# Altium footprint library Hydra_Ref_pcb.PcbLib: 353 footprints (part 13 of 23)
Each footprint in its own frame and in the unit in brackets; x right, y up, seen from the top. Pads: shape width x height; smd on the part's side, far side on the other; paste and mask are expansions set on the pad; w line width, h text height; cw(c..) or ccw(c..) is an arc to the next point about the centre after c.
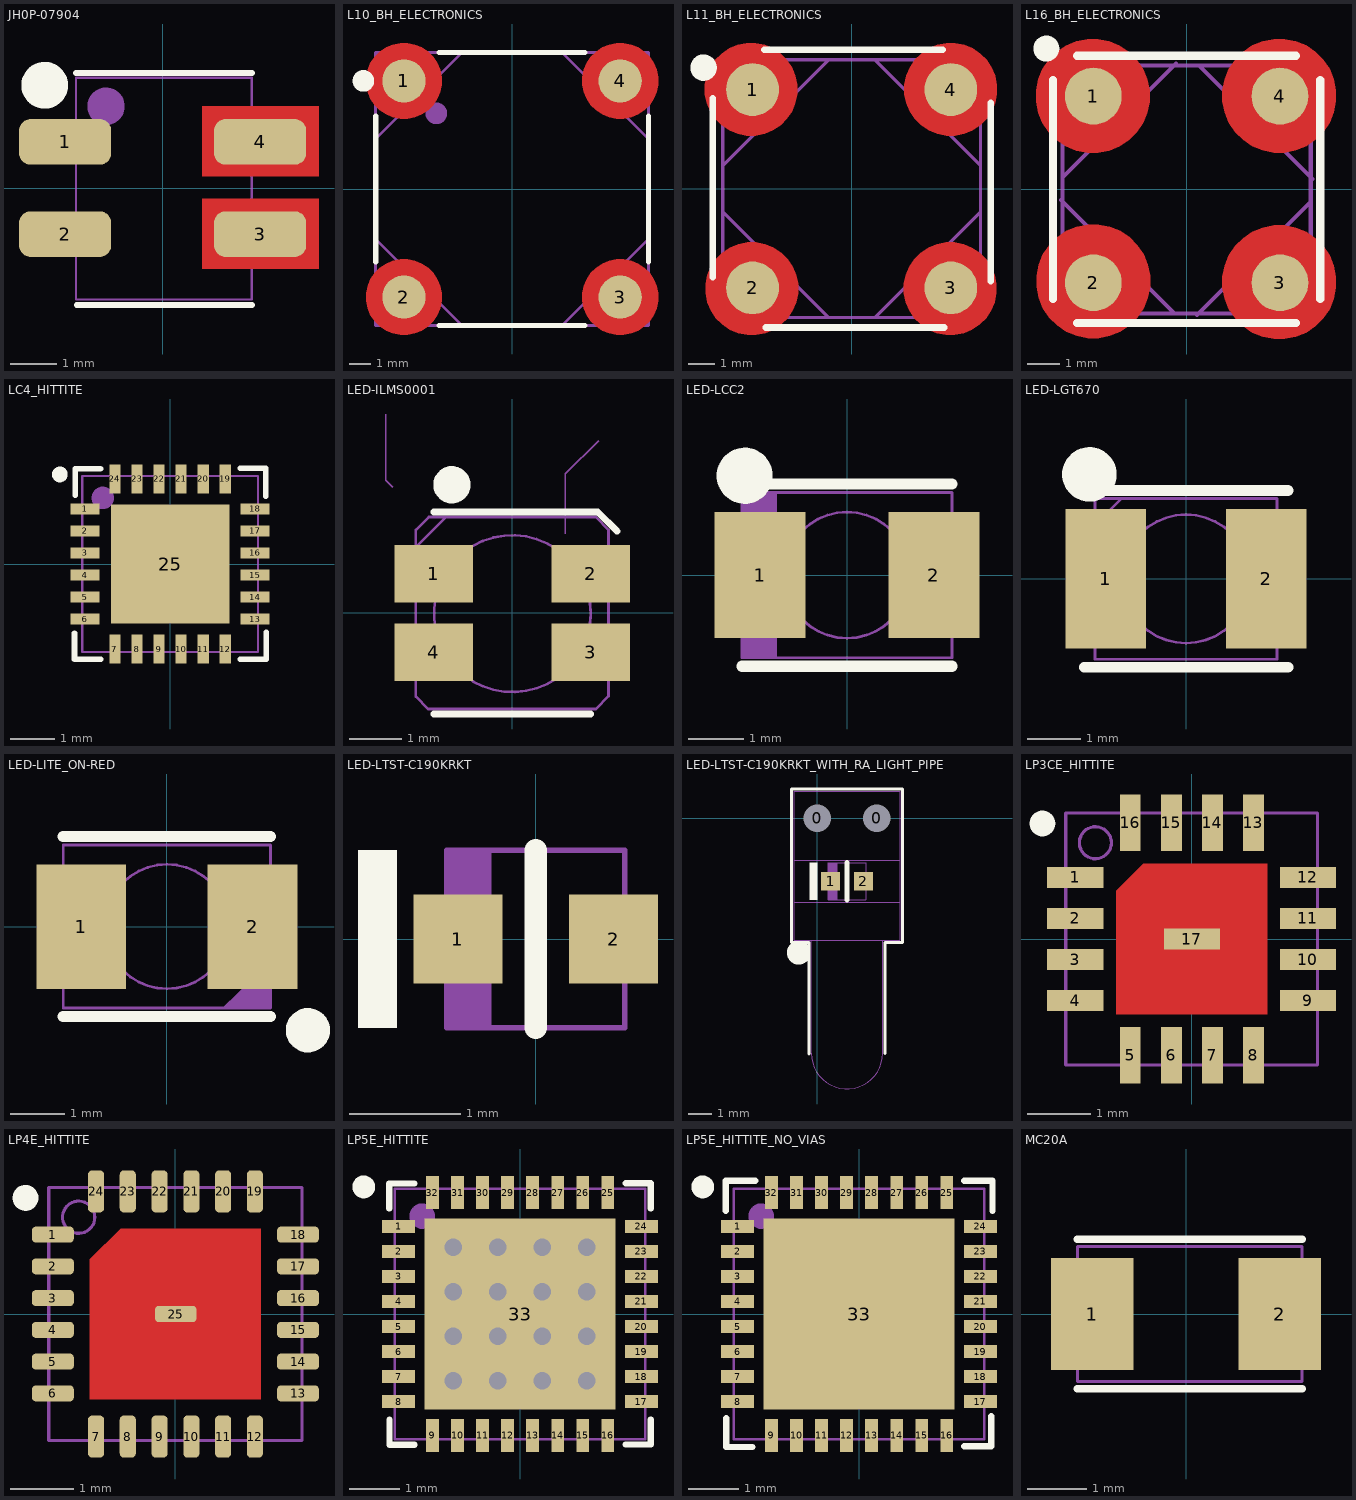
[diagram p12: the footprints below, top view; thin cyan lines are the x and y axes]

## JH0P-07904 [mil] "old part"
height 68.9
pads (4):
  rrect50% 79x39 smd: 1(-83.5,39.5) 2(-83.5,-39.5) 3(83.5,-39.5) 4(83.5,39.5)
Top Layer:
  pour cut-out: 134,-9 34,-9 34,-69 134,-69
  pour cut-out: 134,70 34,70 34,10 134,10
Top Overlay:
  circle w20: c-101,88 r10
  lines w5: -74.16,98.55 76.5,98.56 ; -73.5,-100.26 76.5,-100.26
9 Top Assy:
  circle w20: c-48.5,70 r6
  lines w2: -44.24,94.5 76.5,94.5 ; 76.5,94.5 76.5,-95.5 -74.16,-95.5 -74.16,94.5 76.5,94.5
  text ".Designator" at 44,-82 h50
3D body: height 68.9, standoff 0.39, extent -135,-110 135,110

## L10_BH_ELECTRONICS [mil]
height 260
pads (4):
  round 80 smd mask+3: 1(-200,200) 2(-200,-200) 3(200,-200) 4(200,200)
Top Layer:
  pour cut-out: -200,270 -193.11,270 -179.58,267.31 -166.84,262.03 -155.38,254.37 -145.63,244.62 -137.97,233.16 -132.69,220.42 -130,206.89 -130,200 -130,193.11 -132.69,179.58 -137.97,166.84 -145.63,155.38 -155.38,145.63 -166.84,137.97 -179.58,132.69 -193.11,130 -200,130 -206.89,130 -220.42,132.69 -233.16,137.97 -244.62,145.63 -254.37,155.38 -262.03,166.84 -267.31,179.58 -270,193.11 -270,200 -270,206.89 -267.31,220.42 -262.03,233.16 -254.37,244.62 -244.62,254.37 -233.16,262.03 -220.42,267.31 -206.89,270
  pour cut-out: 200,270 206.89,270 220.42,267.31 233.16,262.03 244.62,254.37 254.37,244.62 262.03,233.16 267.31,220.42 270,206.89 270,200 270,193.11 267.31,179.58 262.03,166.84 254.37,155.38 244.62,145.63 233.16,137.97 220.42,132.69 206.89,130 200,130 193.11,130 179.58,132.69 166.84,137.97 155.38,145.63 145.63,155.38 137.97,166.84 132.69,179.58 130,193.11 130,200 130,206.89 132.69,220.42 137.97,233.16 145.63,244.62 155.38,254.37 166.84,262.03 179.58,267.31 193.11,270
  pour cut-out: -200,-130 -193.11,-130 -179.58,-132.69 -166.84,-137.97 -155.38,-145.63 -145.63,-155.38 -137.97,-166.84 -132.69,-179.58 -130,-193.11 -130,-200 -130,-206.89 -132.69,-220.42 -137.97,-233.16 -145.63,-244.62 -155.38,-254.37 -166.84,-262.03 -179.58,-267.31 -193.11,-270 -200,-270 -206.89,-270 -220.42,-267.31 -233.16,-262.03 -244.62,-254.37 -254.37,-244.62 -262.03,-233.16 -267.31,-220.42 -270,-206.89 -270,-200 -270,-193.11 -267.31,-179.58 -262.03,-166.84 -254.37,-155.38 -244.62,-145.63 -233.16,-137.97 -220.42,-132.69 -206.89,-130
  pour cut-out: 200,-130 206.89,-130 220.42,-132.69 233.16,-137.97 244.62,-145.63 254.37,-155.38 262.03,-166.84 267.31,-179.58 270,-193.11 270,-200 270,-206.89 267.31,-220.42 262.03,-233.16 254.37,-244.62 244.62,-254.37 233.16,-262.03 220.42,-267.31 206.89,-270 200,-270 193.11,-270 179.58,-267.31 166.84,-262.03 155.38,-254.37 145.63,-244.62 137.97,-233.16 132.69,-220.42 130,-206.89 130,-200 130,-193.11 132.69,-179.58 137.97,-166.84 145.63,-155.38 155.38,-145.63 166.84,-137.97 179.58,-132.69 193.11,-130
Top Overlay:
  circle w20: c-275,200 r10
  lines w10: -252.5,-135 -252.5,135 ; -135,-252.5 135,-252.5 ; -135,252.5 135,252.5 ; 252.5,-135 252.5,135
9 Top Assy:
  circle w20: c-140,140 r10
  lines w5: -252.25,-92.75 -92.5,-252.5 ; -252.25,92.75 -92.75,252.25 ; -115,252.5 -105,252.5 ; 92.75,-252.25 252.75,-92.25 ; 92.75,252.25 252.5,92.5 ; -252.5,-252.5 252.5,-252.5 252.5,252.5 -252.5,252.5 -252.5,-252.5
  text ".Designator" at -145,-15 h38
3D body: height 260, standoff 0, extent -252.5,-252.5 252.5,252.5

## L11_BH_ELECTRONICS [mil]
height 195
pads (4):
  round 80 smd mask+3: 1(-150,150) 2(-150,-150) 3(150,-150) 4(150,150)
Top Layer:
  pour cut-out: 148.89,-81.08 155.78,-81.08 169.31,-83.77 182.05,-89.05 193.51,-96.71 203.26,-106.46 210.92,-117.92 216.2,-130.66 218.89,-144.19 218.89,-151.08 218.89,-157.98 216.2,-171.5 210.92,-184.24 203.26,-195.7 193.51,-205.45 182.05,-213.12 169.31,-218.39 155.78,-221.08 148.89,-221.08 141.99,-221.08 128.47,-218.39 115.73,-213.12 104.27,-205.45 94.52,-195.7 86.86,-184.24 81.58,-171.5 78.89,-157.98 78.89,-151.08 78.89,-144.19 81.58,-130.66 86.86,-117.92 94.52,-106.46 104.27,-96.71 115.73,-89.05 128.47,-83.77 141.99,-81.08
  pour cut-out: -151.02,-81.08 -144.12,-81.08 -130.6,-83.77 -117.86,-89.05 -106.39,-96.71 -96.64,-106.46 -88.98,-117.92 -83.71,-130.66 -81.02,-144.19 -81.02,-151.08 -81.02,-157.98 -83.71,-171.5 -88.98,-184.24 -96.64,-195.7 -106.39,-205.46 -117.86,-213.12 -130.6,-218.39 -144.12,-221.08 -151.02,-221.08 -157.91,-221.08 -171.43,-218.39 -184.17,-213.12 -195.64,-205.46 -205.39,-195.7 -213.05,-184.24 -218.33,-171.5 -221.02,-157.98 -221.02,-151.08 -221.02,-144.19 -218.33,-130.66 -213.05,-117.92 -205.39,-106.46 -195.64,-96.71 -184.17,-89.05 -171.43,-83.77 -157.91,-81.08
  pour cut-out: 149.89,220.14 156.78,220.14 170.31,217.45 183.05,212.17 194.51,204.51 204.26,194.76 211.92,183.3 217.2,170.56 219.89,157.03 219.89,150.14 219.89,143.24 217.2,129.72 211.92,116.98 204.26,105.52 194.51,95.77 183.05,88.11 170.31,82.83 156.78,80.14 149.89,80.14 142.99,80.14 129.47,82.83 116.73,88.11 105.27,95.77 95.52,105.52 87.86,116.98 82.58,129.72 79.89,143.24 79.89,150.14 79.89,157.03 82.58,170.56 87.86,183.3 95.52,194.76 105.27,204.51 116.73,212.17 129.47,217.45 142.99,220.14
  pour cut-out: -152.34,220.14 -145.44,220.14 -131.92,217.45 -119.18,212.17 -107.71,204.51 -97.96,194.76 -90.3,183.3 -85.03,170.56 -82.34,157.03 -82.34,150.14 -82.34,143.24 -85.03,129.72 -90.3,116.98 -97.96,105.52 -107.71,95.77 -119.18,88.11 -131.92,82.83 -145.44,80.14 -152.34,80.14 -159.23,80.14 -172.76,82.83 -185.49,88.11 -196.96,95.77 -206.71,105.52 -214.37,116.98 -219.65,129.72 -222.34,143.24 -222.34,150.14 -222.34,157.03 -219.65,170.56 -214.37,183.3 -206.71,194.76 -196.96,204.51 -185.49,212.17 -172.76,217.45 -159.23,220.14
Top Overlay:
  circle w20: c-224.07,183.14 r10
  lines w10: -210,-133.58 -210,136.42 ; -132.02,210 137.98,210 ; -130,-210 140,-210 ; 210.62,-140 210.62,130
9 Top Assy:
  circle w20: c-140,140 r10
  lines w5: -195,-35 -35.25,-194.75 ; -194.5,35.5 -35,195 ; 35,-195 195,-35 ; 35,195 194.75,35.25 ; -195,-195 -195,195 195,195 195,-195 -195,-195
  text ".Designator" at -145,-15 h38
3D body: height 195, standoff 0, extent -195,-195 195,195
3D body: height 260, standoff 0, extent -195,195 195,195

## L16_BH_ELECTRONICS [mil]
height 150
pads (4):
  round 70 smd mask+3: 1(-115,115) 2(-115,-115) 3(115,-115) 4(115,115)
Top Layer:
  pour cut-out: 114.11,-44.34 121,-44.34 134.53,-47.03 147.27,-52.3 158.73,-59.96 168.48,-69.71 176.14,-81.18 181.42,-93.92 184.11,-107.44 184.11,-114.34 184.11,-121.23 181.42,-134.76 176.14,-147.49 168.48,-158.96 158.73,-168.71 147.27,-176.37 134.53,-181.65 121,-184.34 114.11,-184.34 107.22,-184.34 93.69,-181.65 80.95,-176.37 69.49,-168.71 59.74,-158.96 52.08,-147.49 46.8,-134.76 44.11,-121.23 44.11,-114.34 44.11,-107.44 46.8,-93.92 52.08,-81.18 59.74,-69.71 69.49,-59.96 80.95,-52.3 93.69,-47.03 107.22,-44.34
  pour cut-out: -115,-43.27 -108.11,-43.27 -94.58,-45.96 -81.84,-51.23 -70.38,-58.89 -60.63,-68.64 -52.97,-80.11 -47.69,-92.85 -45,-106.37 -45,-113.27 -45,-120.16 -47.69,-133.68 -52.97,-146.42 -60.63,-157.89 -70.38,-167.64 -81.84,-175.3 -94.58,-180.58 -108.11,-183.27 -115,-183.27 -121.9,-183.27 -135.42,-180.58 -148.16,-175.3 -159.62,-167.64 -169.37,-157.89 -177.04,-146.42 -182.31,-133.68 -185,-120.16 -185,-113.27 -185,-106.37 -182.31,-92.85 -177.04,-80.11 -169.37,-68.64 -159.62,-58.89 -148.16,-51.23 -135.42,-45.96 -121.9,-43.27
  pour cut-out: 114.11,185.41 121,185.41 134.53,182.72 147.27,177.44 158.73,169.78 168.48,160.03 176.14,148.56 181.42,135.83 184.11,122.3 184.11,115.41 184.11,108.51 181.42,94.99 176.14,82.25 168.48,70.79 158.73,61.03 147.27,53.37 134.53,48.1 121,45.41 114.11,45.41 107.22,45.41 93.69,48.1 80.95,53.37 69.49,61.03 59.74,70.79 52.08,82.25 46.8,94.99 44.11,108.51 44.11,115.41 44.11,122.3 46.8,135.83 52.08,148.56 59.74,160.03 69.49,169.78 80.95,177.44 93.69,182.72 107.22,185.41
  pour cut-out: -115.66,185.14 -108.77,185.14 -95.24,182.45 -82.51,177.17 -71.04,169.51 -61.29,159.76 -53.63,148.3 -48.35,135.56 -45.66,122.03 -45.66,115.14 -45.66,108.24 -48.35,94.72 -53.63,81.98 -61.29,70.52 -71.04,60.77 -82.51,53.11 -95.24,47.83 -108.77,45.14 -115.66,45.14 -122.56,45.14 -136.08,47.83 -148.82,53.11 -160.29,60.77 -170.04,70.52 -177.7,81.98 -182.97,94.72 -185.66,108.24 -185.66,115.14 -185.66,122.03 -182.97,135.56 -177.7,148.3 -170.04,159.76 -160.29,169.51 -148.82,177.17 -136.08,182.45 -122.56,185.14
Top Overlay:
  circle w16: c-173,173.62 r8
  lines w10: -164.74,-135 -164.74,135 ; -135,-164.74 135,-164.74 ; -135,164.74 135,164.74 ; 164.74,-135 164.74,135
9 Top Assy:
  circle w20: c-105.34,110 r10
  lines w5: -155,-13 -15,-153 ; -153,15 -13,155 ; 13,-155 153,-15 ; 15,153 155,13 ; -153,-153 -153,153 153,153 153,-153 -153,-153
  text ".Designator" at -145,-15 h38
3D body: height 150, standoff 0, extent -153,-153 153,153

## LC4_HITTITE [mil] "QFN Plastic Package 157X157X40(mil)"
height 40
pads (25):
  rect 26x10 smd: 1(-76,49.25) 2(-76,29.55) 3(-76,9.85) 4(-76,-9.85) 5(-76,-29.55) 6(-76,-49.25) 13(76,-49.25) 14(76,-29.55) 15(76,-9.85) 16(76,9.85) 17(76,29.55) 18(76,49.25)
  rect 10x26 smd: 7(-49.25,-76) 8(-29.55,-76) 9(-9.85,-76) 10(9.85,-76) 11(29.55,-76) 12(49.25,-76) 19(49.25,76) 20(29.55,76) 21(9.85,76) 22(-9.85,76) 23(-29.55,76) 24(-49.25,76)
  rect 106x106 smd mask-4: 25(0,0)
Top Overlay:
  circle w7: c-98.5,80 r3.5
  lines w5: -85.4,-62 -85.4,-85.2 -62,-85.2 ; -84.6,61.3 -84.6,85 -62.2,85 ; 62.6,85.6 85.3,85.6 85.3,60.6 ; 62.7,-85.1 85.8,-85.1 85.8,-61
Top Solder:
  rectangle: -93,-58 -59,58
  region: 58,-93 58,-59 -58,-59 -58,-93
  region: 93,58 59,58 59,-58 93,-58
  region: -58,93 -58,59 58,59 58,93
  pour cut-out: -62,100 62,100 100,62 100,-62 62,-100 -62,-100 -100,-62 -100,62
9 Top Assy:
  circle w10: c-60.12,59.06 r5
  lines w2: -78.5,-78.5 -78.5,78.5 78.5,78.5 78.5,-78.5 -78.5,-78.5
  text ".Designator" at -49.25,-10 h25
3D body: height 40, standoff 0.39, extent -78.5,-78.5 78.5,78.5

## LED-ILMS0001 [mm] "old part does not have a big pads as suggested in data sheet"
height 2.108
pads (4):
  rect 1.5x1.1 smd: 1(-1.5,0.75) 2(1.5,0.75) 3(1.5,-0.75) 4(-1.5,-0.75)
Top Overlay:
  circle w0.356: c-1.154,2.45 r0.178
  lines w0.127: -1.5,-1.93 1.5,-1.93 ; -1.5,1.93 1.634,1.93 2,1.564
9 Top Assy:
  circle w0.051: c0,-0.013 r1.499
  lines w0.051: -1.844,1.258 -1.268,1.834 ; -1.844,-1.6 -1.844,1.585 -1.595,1.834 1.595,1.834 1.839,1.59 1.839,-1.59 1.595,-1.834 -1.61,-1.834 -1.844,-1.6
  text ".Designator" at -1.25,-0.25 h0.71
22 Part Dimentions & Info:
  lines w0.025: -2.416,3.802 -2.416,2.532 -2.289,2.405 ; 1.013,1.516 1.013,2.659 1.648,3.294
  text "VLP-250-F" at -1.527,4.056 h0.51
  text "LATB-T66B" at 2.156,3.929 h0.51
3D body: height 2.1, standoff 0.01, extent -2.5,-2.25 2.5,2.25

## LED-LCC2 [mil] "old part"
pads (2):
  rect 65x90 smd: 1(-62,0) 2(62,0)
Top Overlay:
  circle w20: c-72.99,70.87 r10
  lines w8: -75,-65 75,-65 ; -75,65 75,65
9 Top Assy:
  region: -75,-59 -50,-59 -50,59 -75,59
  lines w2: -75,-59 75,-59 75,59 -75,59 -75,-59 ; -45,0 cw(c0,0) 45,0 cw(c0,0) -45,0
  text ".Designator" at -45,-10 h28
3D body: height 0.1, standoff 0, extent -108.27,-78.74 108.27,78.74

## LED-LGT670 [mm] "old part"
height 2.1
pads (2):
  rect 1.5x2.6 smd: 1(-1.5,0) 2(1.5,0)
Top Overlay:
  circle w0.508: c-1.804,1.95 r0.254
  lines w0.203: -1.9,-1.65 1.905,-1.65 ; -1.9,1.65 1.905,1.65
9 Top Assy:
  lines w0.051: -1.7,-1.15 -1.85,-1.15 -1.85,1.15 -1.7,1.15 ; -1.7,1 -1.2,1.5 ; 1.7,-1.15 1.85,-1.15 1.85,1.15 1.7,1.15 ; -1.7,-1.499 -1.7,1.5 1.7,1.5 1.7,-1.499 0.8,-1.499 -0.8,-1.499 -1.7,-1.499 ; -1.2,0 cw(c0,0) 1.2,0 cw(c0,0) -1.2,0
  text ".Designator" at -1.1,-0.25 h0.71
3D body: height 2.1, standoff 0, extent -2.5,-1.75 2.5,2

## LED-LITE_ON-RED [mil] "old part"
pads (2):
  rect 65x90 smd: 1(-62,0) 2(62,0)
Top Overlay:
  circle w16: c102,-75 r8
  lines w8: -75,-65 75,-65 ; -75,65 75,65
9 Top Assy:
  region: 75,-59 75,-58.99 75,-25 40,-59
  lines w2: -75,-59 75,-59 75,59 -75,59 -75,-59 ; -45,0 cw(c0,0) 45,0 cw(c0,0) -45,0
  text ".Designator" at -45,-10 h28
3D body: height 0.1, standoff 0, extent -108.27,-78.74 108.27,78.74

## LED-LTST-C190KRKT [mm] "LITE-ON ELECTRONIC"
height 0.9
pads (2):
  rect 0.8x0.8 smd: 1(-0.7,0) 2(0.7,0)
Top Overlay:
  rectangle: -1.6,-0.8 -1.25,0.8
  lines w0.203: 0,-0.8 0,0.8
9 Top Assy:
  rectangle: -0.8,0.3 -0.4,0.8
  rectangle: -0.8,-0.8 -0.4,-0.3
  lines w0.051: -0.8,-0.799 -0.8,0.8 0.8,0.8 0.8,-0.799 -0.8,-0.799
  text ".Designator" at -0.7,-0.2 h0.4
3D body: height 0.9, standoff 0, extent -1.6,-1 1.4,1

## LED-LTST-C190KRKT_WITH_RA_LIGHT_PIPE [mil] "LED with G_PN ILLP-00101 and M_PN SLP3-150-250-R, RIGHT ANGLE LIGHT PIPE .25 LONG EMITTER"
height 225
pads (4):
  round 35 hole 46 unplated: 0(0,0) 0(100,0)
  rect 31.5x31.5 smd: 1(22.44,-106) 2(77.56,-106)
Top Overlay:
  circle w20: c-30.99,-226 r10
  rectangle: -12.99,-137.5 0.79,-74.5
  lines w5: -14,-396 -14,-209 -43,-209 -43,49 143,49 143,-209 114,-209 114,-395
  lines w8: 50,-137.5 50,-74.5
9 Top Assy:
  rectangle: 18.5,-94.19 34.25,-74.5
  rectangle: 18.5,-137.5 34.25,-117.81
  lines w2: -39,-141 139,-141 ; -39,-71 139,-71 ; -10,-205 -10,-395 ccw(c50,-395) 110,-395 110,-205 ; -39,-205 -39,45 139,45 139,-205 -39,-205 ; 18.5,-137.44 18.5,-74.5 81.5,-74.5 81.5,-137.44 18.5,-137.44
  text ".Designator" at -31,-194 h45
3D body: height 225, standoff 0, extent -49.05,-395 150,53.37

## LP3CE_HITTITE [mil] "LP3C(E)  HITTITE"
height 40
pads (17):
  rect 35x13 smd mask+2: 1(-72.5,38.4) 2(-72.5,12.8) 3(-72.5,-12.8) 4(-72.5,-38.4) 9(72.5,-38.4) 10(72.5,-12.8) 11(72.5,12.8) 12(72.5,38.4) 17(0.17,0)
  rect 13x35 smd mask+2: 5(-38.23,-72.5) 6(-12.63,-72.5) 7(12.97,-72.5) 8(38.57,-72.5) 13(38.57,72.5) 14(12.97,72.5) 15(-12.63,72.5) 16(-38.23,72.5)
Top Layer:
  region: 47,47 -30,47 -47,30 -47,-47 47,-47
Top Overlay:
  circle w8: c-93,72 r4
Top Paste:
  region: -40.5,-40.5 40.5,-40.5 40.5,40.5 -29,40.5 -40.5,29
Top Solder:
  region: -40.5,-40.5 40.5,-40.5 40.5,40.5 -29,40.5 -40.5,29
9 Top Assy:
  circle w2: c-60,60 r10
  lines w2: -78.5,-78.5 -78.5,78.5 78.5,78.5 78.5,-78.5 -78.5,-78.5
  text ".Designator" at -26,-6 h18
15 Top Optical Placement:
  lines w3.94: -0.03,-12.83 39.34,-12.83 ; 19.65,-32.51 19.65,6.86
3D body: height 39, standoff 0.39, extent -78.5,-78.5 78.52,78.5

## LP4E_HITTITE [mil] "LP4 (E) (QFN-24) HITTITE"
height 40
pads (25):
  rrect50% 26x10 smd mask+2: 1(-76,49.25) 2(-76,29.55) 3(-76,9.85) 4(-76,-9.85) 5(-76,-29.55) 6(-76,-49.25) 13(76,-49.25) 14(76,-29.55) 15(76,-9.85) 16(76,9.85) 17(76,29.55) 18(76,49.25) 25(0.17,0)
  rrect50% 10x26 smd mask+2: 7(-49.25,-76) 8(-29.55,-76) 9(-9.85,-76) 10(9.85,-76) 11(29.55,-76) 12(49.25,-76) 19(49.25,76) 20(29.55,76) 21(9.85,76) 22(-9.85,76) 23(-29.55,76) 24(-49.25,76)
Top Layer:
  region: 53,53 -34,53 -53,34 -53,-53 53,-53
Top Overlay:
  circle w8: c-93,72 r4
Top Paste:
  rectangle: -41,-41 41,41
Top Solder:
  rectangle: -49,-49 49,49
9 Top Assy:
  circle w2: c-60,60 r10
  lines w2: -78.5,-78.5 78.5,-78.5 78.5,78.5 -78.5,78.5 -78.5,-78.5
  text ".Designator" at -20,-5 h18
15 Top Optical Placement:
  lines w3.94: -0.03,-12.83 39.34,-12.83 ; 19.65,-32.51 19.65,6.86
3D body: height 40, standoff 0.39, extent -78.5,-78.5 78.52,78.5

## LP5E_HITTITE [mil] "LP5E 5X5MM QUAD FLATPACK NO-LEAD(QFN) PLASTIC PACKAGE"
height 39
pads (33):
  rect 26x10 smd mask+2: 1(-95.5,68.9) 2(-95.5,49.21) 3(-95.5,29.53) 4(-95.5,9.84) 5(-95.5,-9.84) 6(-95.5,-29.53) 7(-95.5,-49.21) 8(-95.5,-68.9) 17(95.5,-68.9) 18(95.5,-49.21) 19(95.5,-29.53) 20(95.5,-9.84) 21(95.5,9.84) 22(95.5,29.53) 23(95.5,49.21) 24(95.5,68.9)
  rect 10x26 smd mask+2: 9(-68.9,-95.5) 10(-49.21,-95.5) 11(-29.53,-95.5) 12(-9.84,-95.5) 13(9.84,-95.5) 14(29.53,-95.5) 15(49.21,-95.5) 16(68.9,-95.5) 25(68.9,95.5) 26(49.21,95.5) 27(29.53,95.5) 28(9.84,95.5) 29(-9.84,95.5) 30(-29.53,95.5) 31(-49.21,95.5) 32(-68.9,95.5)
  rect 150x150 smd paste-6 mask-6: 33(0,0)
via 52.5,52.5 diameter 28 hole 14
via -52.5,-17.5 diameter 28 hole 14
via -17.5,52.5 diameter 28 hole 14
via 17.5,52.5 diameter 28 hole 14
via -52.5,52.5 diameter 28 hole 14
via -52.5,-52.5 diameter 28 hole 14
via 52.5,-52.5 diameter 28 hole 14
via -17.5,-52.5 diameter 28 hole 14
via 17.5,-52.5 diameter 28 hole 14
via -52.5,17.5 diameter 28 hole 14
via -17.5,17.5 diameter 28 hole 14
via -17.5,-17.5 diameter 28 hole 14
via 17.5,-17.5 diameter 28 hole 14
via 17.5,17.5 diameter 28 hole 14
via 52.5,17.5 diameter 28 hole 14
via 52.5,-17.5 diameter 28 hole 14
Top Overlay:
  circle w9: c-123,100 r4.5
  lines w5: -102.9,83 -102.9,102.7 -83,102.7 ; -102.7,-83 -102.7,-102.9 -83,-102.9 ; 83,-102.7 102.9,-102.7 102.9,-83 ; 83,102.9 102.7,102.9 102.7,83
9 Top Assy:
  circle w10: c-77,77 r5
  lines w2: -98.43,-98.43 -98.43,98.43 98.43,98.43 98.43,-98.43 -98.43,-98.43
  text ".Designator" at -71.6,-13.3 h25
3D body: height 39, standoff 0.39, extent -98.43,-98.43 98.43,98.43

## LP5E_HITTITE_NO_VIAS [mil] "LP5E 5X5MM QUAD FLATPACK NO-LEAD(QFN) PLASTIC PACKAGE"
height 39
pads (33):
  rect 26x10 smd mask+2: 1(-95.5,68.9) 2(-95.5,49.21) 3(-95.5,29.53) 4(-95.5,9.84) 5(-95.5,-9.84) 6(-95.5,-29.53) 7(-95.5,-49.21) 8(-95.5,-68.9) 17(95.5,-68.9) 18(95.5,-49.21) 19(95.5,-29.53) 20(95.5,-9.84) 21(95.5,9.84) 22(95.5,29.53) 23(95.5,49.21) 24(95.5,68.9)
  rect 10x26 smd mask+2: 9(-68.9,-95.5) 10(-49.21,-95.5) 11(-29.53,-95.5) 12(-9.84,-95.5) 13(9.84,-95.5) 14(29.53,-95.5) 15(49.21,-95.5) 16(68.9,-95.5) 25(68.9,95.5) 26(49.21,95.5) 27(29.53,95.5) 28(9.84,95.5) 29(-9.84,95.5) 30(-29.53,95.5) 31(-49.21,95.5) 32(-68.9,95.5)
  rect 150x150 smd paste-6 mask-6: 33(0,0)
Top Overlay:
  circle w9: c-123,100 r4.5
  lines w5: -104.9,81.2 -104.9,104.7 -81.6,104.7 ; -104.5,-82.1 -104.5,-104.6 -83.8,-104.6 ; 82.6,104.8 105,104.8 105,81.3 ; 82.7,-103.9 103.9,-103.9 103.9,-80.4
9 Top Assy:
  circle w10: c-77,77 r5
  lines w2: -98.43,-98.43 98.43,-98.43 98.43,98.43 -98.43,98.43 -98.43,-98.43
  text ".Designator" at -71.6,-13.3 h25
3D body: height 39, standoff 0.39, extent -98.43,-98.43 98.43,98.43

## MC20A [mil] "old part"
height 39.37
pads (2):
  rect 55x75 smd: 1(-62.5,0) 2(62.5,0)
Top Overlay:
  lines w5: -72.5,-50 77.5,-50 ; -72.5,50 77.5,50
9 Top Assy:
  lines w2: -72.5,-45 -72.5,45 77.5,45 77.5,-45 -72.5,-45
  text ".Designator" at -67.5,-20 h40
3D body: height 40, standoff 0, extent -100,-60 100,60